# Altium footprint library StarKit PCB.PcbLib: 37 footprints (part 3 of 3)
Each footprint in its own frame and in the unit in brackets; x right, y up, seen from the top. Pads: shape width x height; smd on the part's side, far side on the other; paste and mask are expansions set on the pad; w line width, h text height; cw(c..) or ccw(c..) is an arc to the next point about the centre after c.
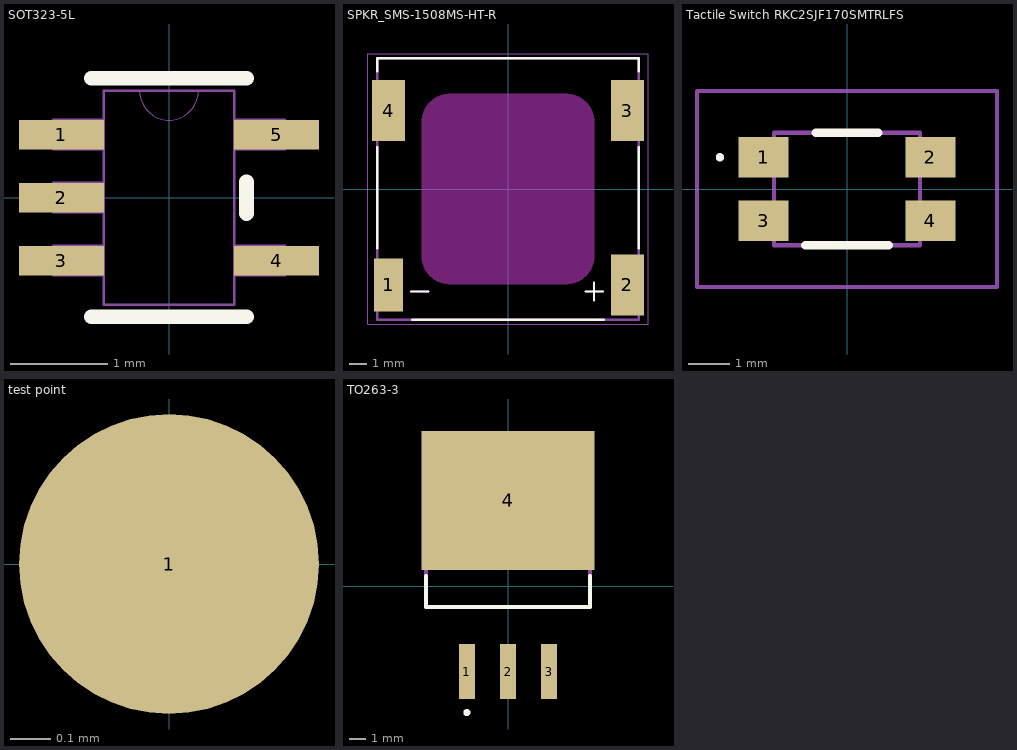
[diagram p2: the footprints below, top view; thin cyan lines are the x and y axes]

## SOT323-5L [mil]
pads (5):
  rect 34.5x12 smd paste+0 mask+0: 1(-43.75,25.59) 2(-43.75,0) 3(-43.75,-25.59) 4(43.75,-25.59) 5(43.75,25.59)
Top Overlay:
  lines w6: -31.5,-48.5 31.5,-48.5 ; -31.5,48.5 31.5,48.5 ; 31.5,-6.49 31.5,6.49
Mechanical 13:
  lines w0: -12,43.5 ccw(c0,43.5) 12,43.5
  lines w1: -47,-31.59 -26.5,-31.59 -26.5,-19.59 -47,-19.59 -47,-31.59 ; -47,-6 -26.5,-6 -26.5,6 -47,6 -47,-6 ; -47,19.59 -26.5,19.59 -26.5,31.59 -47,31.59 -47,19.59 ; -26.5,-43.5 -26.5,43.5 26.5,43.5 26.5,-43.5 -26.5,-43.5 ; 26.5,-31.59 47,-31.59 47,-19.59 26.5,-19.59 26.5,-31.59 ; 26.5,19.59 47,19.59 47,31.59 26.5,31.59 26.5,19.59
3D body "SOT323-5L_STM.step": height 43.11, standoff 0, extent -47.01,-43.5 47.01,43.5

## SPKR_SMS-1508MS-HT-R [mm]
pads (4):
  rect 1.651x3.048 smd mask-0.025: 1(-6.85,-5.5)
  rect 1.9x3.5 smd mask-0.025: 2(6.85,-5.5) 3(6.85,4.5) 4(-6.85,4.5)
Top Overlay:
  lines w0.127: -7.5,-3.4 -7.5,2.4 ; -7.5,6.75 -7.5,7.5 7.5,7.5 7.5,6.75 ; -5.563,-5.881 -4.563,-5.881 ; -5.5,-7.5 5.5,-7.5 ; 4.436,-5.881 5.436,-5.881 ; 4.936,-6.381 4.936,-5.381 ; 7.5,-3.4 7.5,2.4
Keep-Out Layer:
  drawing of 2 lines, arcs and shapes, not listed
Mechanical 13:
  lines w0.127: -5.563,-5.881 -4.563,-5.881 ; 4.436,-5.881 5.436,-5.881 ; 4.936,-6.381 4.936,-5.381 ; -7.5,-7.5 -7.5,7.5 7.5,7.5 7.5,-7.5 -7.5,-7.5
Mechanical 15:
  lines w0.05: -8.05,-7.75 -8.05,7.75 8.05,7.75 8.05,-7.75 -8.05,-7.75
3D body "step_temp.STEP": height 4.05, standoff 0, extent -7.5,-7.5 7.5,7.5

## Tactile Switch RKC2SJF170SMTRLFS [mm]
pads (4):
  rect 1.2x0.975 smd: 1(-2,0.762) 2(2,0.762) 3(-2,-0.762) 4(2,-0.762)
Top Overlay:
  lines w0.1: -3.1,0.762 ccw(c-3.05,0.762) -3,0.762 ccw(c-3.05,0.762) -3.1,0.762
  lines w0.2: -1,-1.35 1,-1.35 ; -0.75,1.35 0.75,1.35
Mechanical 15:
  lines w0.1: -1.75,-1.35 1.75,-1.35 1.75,1.35 -1.75,1.35 -1.75,-1.35
Mechanical 20:
  lines w0.1: -3.6,-2.35 3.6,-2.35 3.6,2.35 -3.6,2.35 -3.6,-2.35
3D body "RKC2SJF170SMTR_LFS.stp": height 1.7, standoff 0, extent -2.141,-1.483 2.159,1.397

## test point [mm]
pads (1):
  round 0.75 smd: 1(0,0)

## TO263-3 [mm]
height 5
pads (4):
  rect 1x3.4 smd: 1(-2.54,-5.3) 2(0,-5.3) 3(2.54,-5.3)
  rect 10.7x8.6 smd: 4(0,5.3)
Top Overlay:
  circle w0.254: c-2.544,-7.827 r0.092
  lines w0.254: -5.08,0.633 -5.08,-1.3 5.08,-1.3 5.08,0.633
Mechanical 13:
  lines w0.254: -5.08,-1.3 5.08,-1.3 5.08,7.7 -5.08,7.7 -5.08,-1.3
3D body "User Library-TO263-3.STEP": height 4.83, standoff 0.03, extent -5,-6.387 5,9.283